# Altium footprint library My Footprint 3D.PCBLIB: 447 footprints (part 19 of 29)
Each footprint in its own frame and in the unit in brackets; x right, y up, seen from the top. Pads: shape width x height; smd on the part's side, far side on the other; paste and mask are expansions set on the pad; w line width, h text height; cw(c..) or ccw(c..) is an arc to the next point about the centre after c.
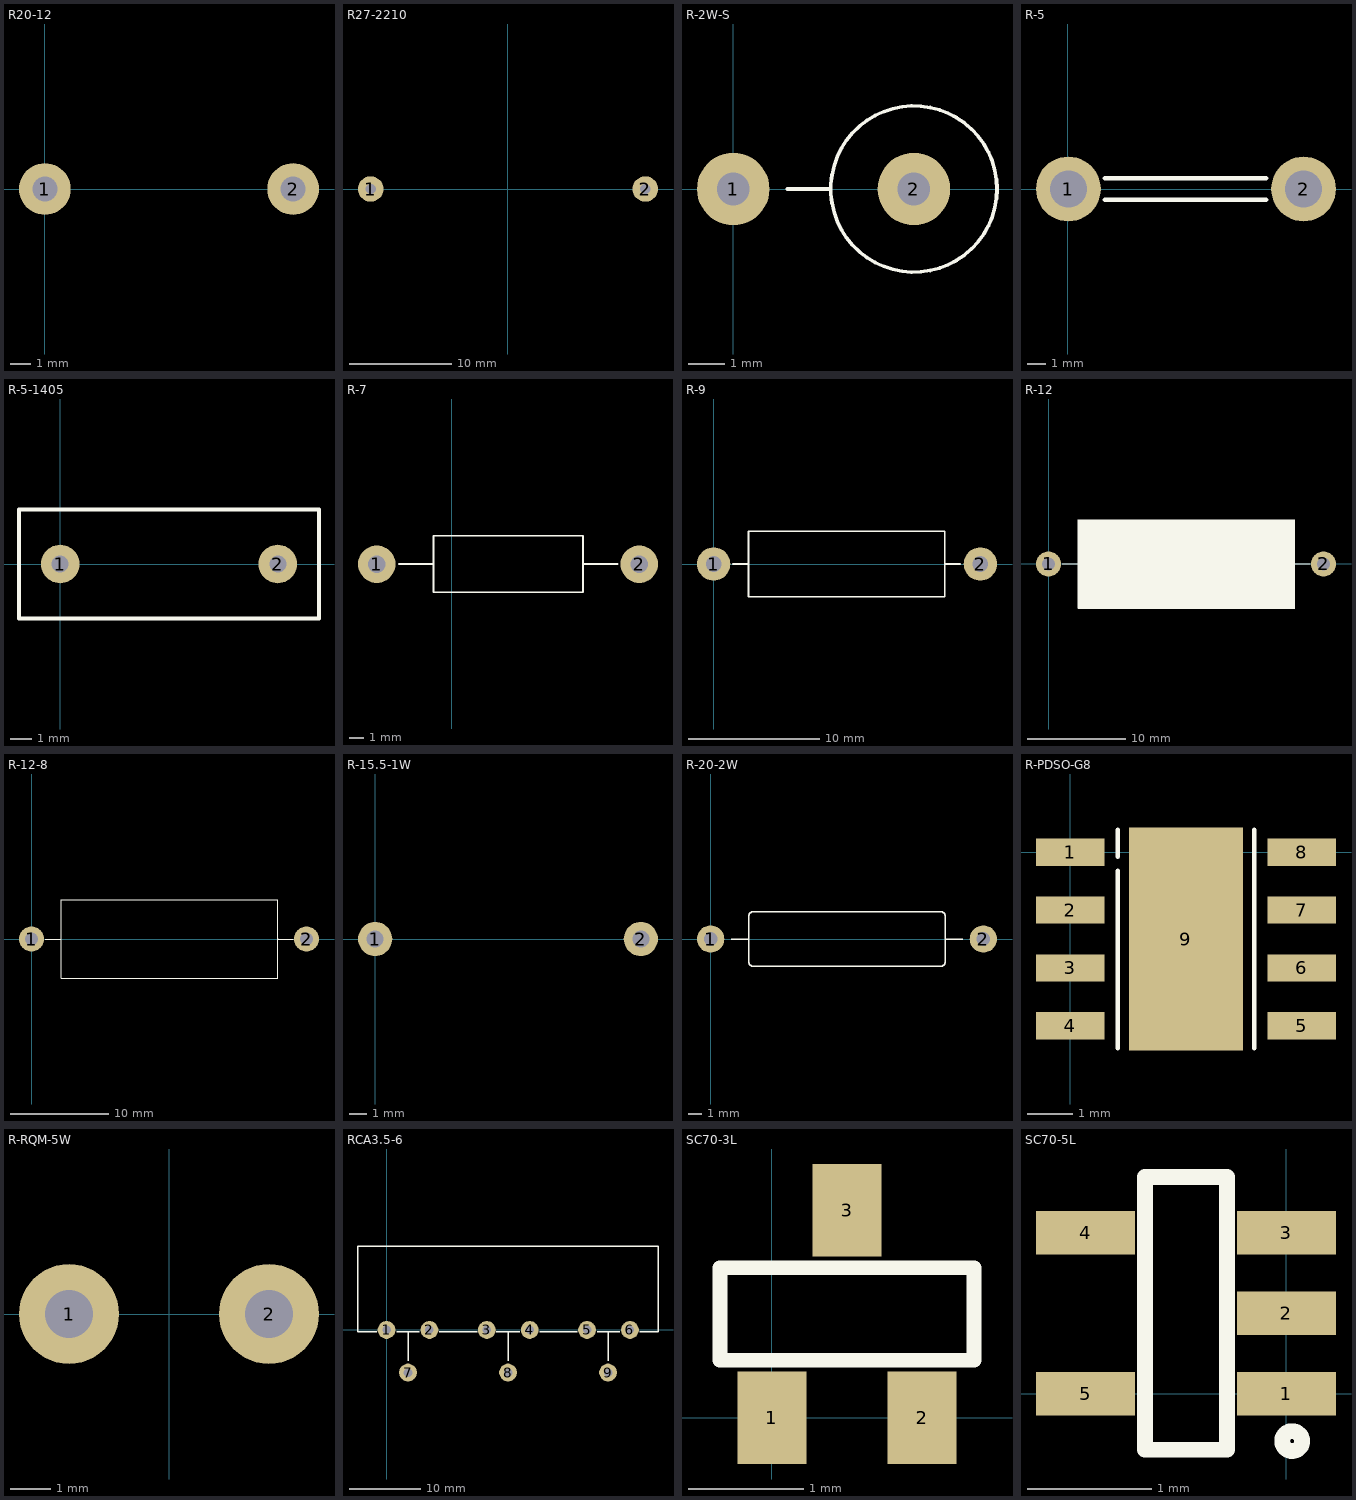
[diagram p18: the footprints below, top view; thin cyan lines are the x and y axes]

## R20-12 [mm]
pads (2):
  round 2.5 hole 1.2: 1(0,0) 2(12,0)
3D body: height 23.98, standoff 4.02, extent -3.96,-2.5 15.961,2.5
3D body: height 8, standoff -2, extent -0.496,-0.499 0.5,0.499
3D body: height 8, standoff -2, extent 11.504,-0.499 12.5,0.499
3D body: height 11.5, standoff 1.5, extent -0.796,-0.799 0.798,0.798
3D body: height 11.5, standoff 1.5, extent 11.204,-0.799 12.798,0.798

## R27-2210 [mm] "5W 水泥电阻"
pads (2):
  round 2.5 hole 1: 1(-13.5,0) 2(13.5,0)
3D body: height 9, standoff 0, extent -11,-5 11,5
3D body: height 9.5, standoff 8.5, extent -10,-4 10,4
3D body: height 5.4, standoff 4.6, extent 10.902,-0.4 13.902,0.399
3D body: height 5, standoff -2, extent 13.103,-0.399 13.9,0.399
3D body: height 5, standoff -2, extent -13.9,-0.399 -13.103,0.399
3D body: height 5.4, standoff 4.6, extent -13.902,-0.399 -10.902,0.4

## R-2W-S [mil]
pads (2):
  round 79 hole 35.43: 1(0,0) 2(196.85,0)
Top Overlay:
  circle w3.94: c196.85,0 r90.55
  lines w3.94: 59.06,0 106.3,0

## R-5 [mm]
pads (2):
  round 3.5 hole 2: 1(0.025,0.025) 2(12.725,0.025)
Top Overlay:
  lines w0.254: 2,-0.549 10.7,-0.549 ; 2,0.6 10.7,0.6
3D body: height 1.8, standoff -1.5, extent 11.913,-0.797 13.506,0.8
3D body: height 1.8, standoff -1.5, extent -0.787,-0.797 0.806,0.8
3D body: height 1.79, standoff 0.2, extent 0.025,-0.773 12.725,0.824

## R-5-1405 [mm]
height 17
pads (2):
  round 1.8 hole 0.8: 1(0,0) 2(10.16,0)
Top Overlay:
  lines w0.2: -1.92,-2.54 12.08,-2.54 12.08,2.54 -1.92,2.54 -1.92,-2.54

## R-7 [mm] "2W"
pads (2):
  round 2.54 hole 1.2: 1(-5.08,-15.24) 2(12.7,-15.24)
Top Overlay:
  lines w0.127: -3.573,-15.24 -1.23,-15.24 ; 8.89,-15.24 11.233,-15.24 ; -1.23,-17.145 -1.23,-13.31 8.89,-13.31 8.89,-17.145 -1.23,-17.145

## R-9 [mm] "3W"
pads (2):
  round 2.54 hole 1.2: 1(0,0) 2(20.32,0)
Top Overlay:
  lines w0.127: 1.45,0 2.65,0 ; 17.596,0 18.796,0 ; 2.65,-2.5 17.596,-2.5 17.596,2.5 2.65,2.5 2.65,-2.5

## R-12 [mm] "5W"
pads (2):
  round 2.54 hole 1.3: 1(0,0) 2(27.94,0)
Top Overlay:
  rectangle: 3,-4.5 25,4.5
  lines w0.127: 1.4,0 3,0 ; 25,0.025 25.025,0 26.6,0 ; 3,-4.5 25,-4.5 25,4.5 3,4.5 3,-4.5

## R-12-8 [mm]
pads (2):
  round 2.54 hole 1.3: 1(0,0) 2(27.94,0)
Top Overlay:
  lines w0.127: 1.4,0 3,0 ; 25,0.025 25.025,0 26.6,0 ; 3,-4 3,4 25,4 25,-4 3,-4

## R-15.5-1W [mm]
pads (2):
  round 2 hole 1: 1(0,0) 2(15.5,0)
3D body "RA电": height 3.65, standoff -3, extent -0.3,-1.65 15.829,1.652

## R-20-2W [mm]
pads (2):
  round 2 hole 1: 1(0,0) 2(20,0)
Top Overlay:
  lines w0.1: 1.5,0 2.8,0 ; 2.8,0 ccw(c2.8,0) 2.8,0 ; 2.8,0 2.8,1.7 cw(c3.1,1.7) 3.1,2 10,2 16.9,2 cw(c16.9,1.7) 17.2,1.7 17.2,0 ; 2.8,0 2.8,-1.7 ccw(c3.1,-1.7) 3.1,-2 10,-2 16.9,-2 ccw(c16.9,-1.7) 17.2,-1.7 17.2,0 ; 17.2,0 18.5,0 ; 18.5,0 ccw(c18.5,0) 18.5,0
3D body: height 4.58, standoff 0, extent 2.5,-2.295 17.5,2.295
3D body: height 2.6, standoff 2, extent 0,-0.3 20,0.299
3D body: height 2.6, standoff -2, extent -0.298,-0.3 0.3,0.299
3D body: height 2.6, standoff -2, extent 19.703,-0.299 20.3,0.3

## R-PDSO-G8 [mm]
pads (9):
  rect 1.5x0.6 smd: 1(0,0) 2(0,-1.27) 3(0,-2.54) 4(0,-3.81) 5(5.08,-3.81) 6(5.08,-2.54) 7(5.08,-1.27) 8(5.08,0)
  rect 2.5x4.9 smd: 9(2.54,-1.905)
Top Overlay:
  lines w0.1: 1.04,-4.305 1.04,-0.405 ; 1.04,-0.105 1.04,0.495 ; 4.04,-4.305 4.04,0.495
3D body: height 0.2, standoff 0, extent -0.45,-0.25 0.15,0.25
3D body: height 0.9, standoff 0, extent 0.15,-0.25 0.35,0.25
3D body: height 0.9, standoff 0.7, extent 0.35,-0.25 0.55,0.25
3D body: height 0.2, standoff 0, extent -0.45,-1.52 0.15,-1.02
3D body: height 0.9, standoff 0, extent 0.15,-1.52 0.35,-1.02
3D body: height 0.9, standoff 0.7, extent 0.35,-1.52 0.55,-1.02
3D body: height 0.2, standoff 0, extent -0.45,-2.79 0.15,-2.29
3D body: height 0.9, standoff 0, extent 0.15,-2.79 0.35,-2.29
3D body: height 0.9, standoff 0.7, extent 0.35,-2.79 0.55,-2.29
3D body: height 0.2, standoff 0, extent -0.45,-4.06 0.15,-3.56
3D body: height 0.9, standoff 0, extent 0.15,-4.06 0.35,-3.56
3D body: height 0.9, standoff 0.7, extent 0.35,-4.06 0.55,-3.56
3D body: height 0.2, standoff 0, extent 4.93,-4.06 5.53,-3.56
3D body: height 0.9, standoff 0, extent 4.73,-4.06 4.93,-3.56
3D body: height 0.9, standoff 0.7, extent 4.53,-4.06 4.73,-3.56
3D body: height 0.2, standoff 0, extent 4.93,-2.79 5.53,-2.29
3D body: height 0.9, standoff 0, extent 4.73,-2.79 4.93,-2.29
3D body: height 0.9, standoff 0.7, extent 4.53,-2.79 4.73,-2.29
3D body: height 0.2, standoff 0, extent 4.93,-1.52 5.53,-1.02
3D body: height 0.9, standoff 0, extent 4.73,-1.52 4.93,-1.02
3D body: height 0.9, standoff 0.7, extent 4.53,-1.52 4.73,-1.02
3D body: height 0.2, standoff 0, extent 4.93,-0.25 5.53,0.25
3D body: height 0.9, standoff 0, extent 4.73,-0.25 4.93,0.25
3D body: height 0.9, standoff 0.7, extent 4.53,-0.25 4.73,0.25
3D body: height 1.5, standoff 0.2, extent 0.54,-4.455 4.54,0.645
3D body: height 1.61, standoff 0.1, extent 0.975,-0.711 1.971,0.287

## R-RQM-5W [mm]
pads (2):
  round 2.5 hole 1.2: 1(-2.5,0) 2(2.5,0)
3D body: height 3, standoff -2, extent 2.103,-0.399 2.9,0.399
3D body: height 3, standoff -2, extent -2.897,-0.399 -2.1,0.399
3D body: height 2, standoff 0, extent 4.5,-4.5 6.504,4.5
3D body: height 2, standoff 0, extent -6.504,-4.5 -4.5,4.5
3D body: height 25, standoff 2, extent -6.504,-4.504 6.504,4.504

## RCA3.5-6 [mm]
pads (9):
  round 2.5 hole 1.2: 1(0,0) 2(6,0) 3(14.03,0) 4(20.03,0) 5(28.06,0) 6(34.06,0) 7(3,-5.969) 8(17,-5.969) 9(31,-5.969)
Top Overlay:
  lines w0.2: -1.397,-0.254 -4,-0.254 -4,11.684 37.985,11.684 37.985,-0.254 35.433,-0.254 ; 1.397,-0.254 4.572,-0.254 ; 3.048,-4.318 3.048,-0.254 ; 7.366,-0.254 12.7,-0.254 ; 15.367,-0.254 18.669,-0.254 ; 17.048,-4.318 17.048,-0.254 ; 21.463,-0.254 26.67,-0.254 ; 29.464,-0.254 32.639,-0.254 ; 31.048,-4.318 31.048,-0.254

## SC70-3L [mm]
height 4.45
pads (3):
  rect 0.6x0.8 smd: 1(0,0) 2(1.3,0) 3(0.65,1.8)
Top Overlay:
  lines w0.127: -0.45,0.5 -0.45,1.3 1.75,1.3 1.75,0.5 -0.45,0.5

## SC70-5L [mm]
height 1
pads (5):
  rect 0.8x0.35 smd: 1(0,0) 2(0,0.65) 3(0,1.3) 4(-1.62,1.3) 5(-1.62,0)
Top Overlay:
  circle w0.127: c0.047,-0.381 r0.08
  lines w0.127: -1.14,-0.45 -0.48,-0.45 -0.48,1.75 -1.14,1.75 -1.14,-0.45